# Altium footprint library Dart_Controller_Pcblib.PcbLib: 132 footprints (part 7 of 9)
Each footprint in its own frame and in the unit in brackets; x right, y up, seen from the top. Pads: shape width x height; smd on the part's side, far side on the other; paste and mask are expansions set on the pad; w line width, h text height; cw(c..) or ccw(c..) is an arc to the next point about the centre after c.
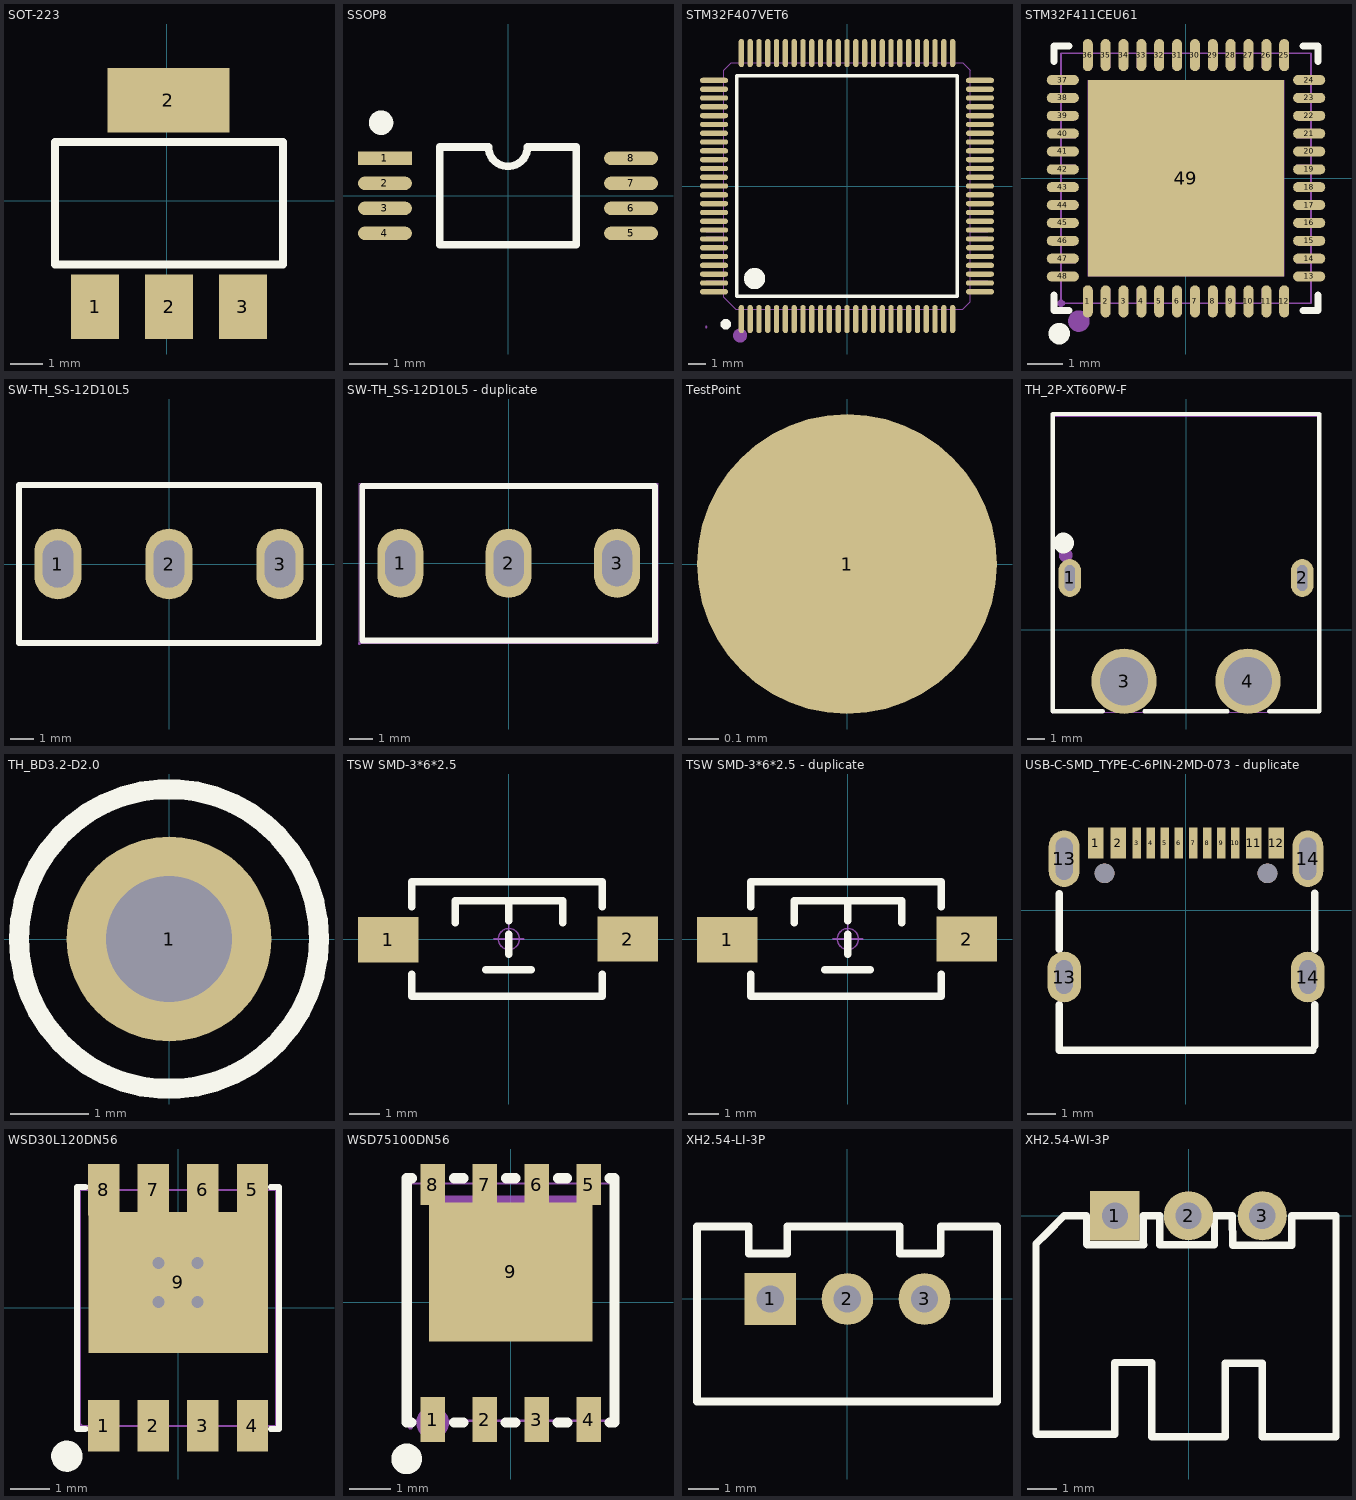
[diagram p6: the footprints below, top view; thin cyan lines are the x and y axes]

## SOT-223 [mil]
pads (4):
  rect 59x79 smd: 1(-88,-130) 2(2.55,-130) 3(93.1,-130)
  rect 150x79 smd: 2(1.88,123.54)
Top Overlay:
  lines w10: -137.45,-78 -137.45,72 142.55,72 142.55,-78 -137.45,-78
3D body "SOT-223_MP04A.STEP": height 66.93, standoff 0, extent -126.41,-138.72 129.5,135.3

## SSOP8 [mm] "3*6.4*1.2mm（蒜米工坊）"
height 9.4
pads (8):
  rect 1.4x0.35 smd: 1(-3.2,0.975)
  oval 1.4x0.35 smd: 2(-3.2,0.325) 3(-3.2,-0.325) 4(-3.2,-0.975) 5(3.2,-0.975) 6(3.2,-0.325) 7(3.2,0.325) 8(3.2,0.975)
Top Overlay:
  circle w0.381: c-3.3,1.9 r0.127
  lines w0.2: -1.778,-1.27 1.778,-1.27 1.778,1.27 0.508,1.27 cw(c0,1.27) -0.508,1.27 -1.778,1.27 -1.778,-1.27
3D body "SSOP8.STEP": height 1.25, standoff -0.03, extent -3.202,-1.75 3.202,1.75

## STM32F407VET6 [mm]
pads (100):
  oval 0.3x1.6 smd paste-100 mask+0.051: 1(-6,-7.55) 2(-5.5,-7.55) 3(-5,-7.55) 4(-4.5,-7.55) 5(-4,-7.55) 6(-3.5,-7.55) 7(-3,-7.55) 8(-2.5,-7.55) 9(-2,-7.55) 10(-1.5,-7.55) 11(-1,-7.55) 12(-0.5,-7.55) 13(0,-7.55) 14(0.5,-7.55) 15(1,-7.55) 16(1.5,-7.55) 17(2,-7.55) 18(2.5,-7.55) 19(3,-7.55) 20(3.5,-7.55) 21(4,-7.55) 22(4.5,-7.55) 23(5,-7.55) 24(5.5,-7.55) 25(6,-7.55) 51(6,7.55) 52(5.5,7.55) 53(5,7.55) 54(4.5,7.55) 55(4,7.55) 56(3.5,7.55) 57(3,7.55) 58(2.5,7.55) 59(2,7.55) 60(1.5,7.55) 61(1,7.55) 62(0.5,7.55) 63(0,7.55) 64(-0.5,7.55) 65(-1,7.55) 66(-1.5,7.55) 67(-2,7.55) 68(-2.5,7.55) 69(-3,7.55) 70(-3.5,7.55) 71(-4,7.55) 72(-4.5,7.55) 73(-5,7.55) 74(-5.5,7.55) 75(-6,7.55)
  oval 1.6x0.3 smd paste-100 mask+0.051: 26(7.55,-6) 27(7.55,-5.5) 28(7.55,-5) 29(7.55,-4.5) 30(7.55,-4) 31(7.55,-3.5) 32(7.55,-3) 33(7.55,-2.5) 34(7.55,-2) 35(7.55,-1.5) 36(7.55,-1) 37(7.55,-0.5) 38(7.55,0) 39(7.55,0.5) 40(7.55,1) 41(7.55,1.5) 42(7.55,2) 43(7.55,2.5) 44(7.55,3) 45(7.55,3.5) 46(7.55,4) 47(7.55,4.5) 48(7.55,5) 49(7.55,5.5) 50(7.55,6) 76(-7.55,6) 77(-7.55,5.5) 78(-7.55,5) 79(-7.55,4.5) 80(-7.55,4) 81(-7.55,3.5) 82(-7.55,3) 83(-7.55,2.5) 84(-7.55,2) 85(-7.55,1.5) 86(-7.55,1) 87(-7.55,0.5) 88(-7.55,0) 89(-7.55,-0.5) 90(-7.55,-1) 91(-7.55,-1.5) 92(-7.55,-2) 93(-7.55,-2.5) 94(-7.55,-3) 95(-7.55,-3.5) 96(-7.55,-4) 97(-7.55,-4.5) 98(-7.55,-5) 99(-7.55,-5.5) 100(-7.55,-6)
Top Overlay:
  lines w0.2: -6.25,-6.25 6.25,-6.25 6.25,6.25 -6.25,6.25 -6.25,-6.25
  lines w0.3: -6.883,-7.696 ccw(c-6.882,-7.846) -6.882,-7.996 ccw(c-6.882,-7.846) -6.881,-7.696
  lines w0.6: -5.25,-4.95 ccw(c-5.248,-5.25) -5.248,-5.55 ccw(c-5.248,-5.25) -5.245,-4.95
Top Paste:
  drawing of 100 lines, arcs and shapes, not listed
Mechanical 6:
  circle w0.4: c-6.071,-8.484 r0.2
Mechanical 15:
  drawing of 209 lines, arcs and shapes, not listed

## STM32F411CEU61 [mm]
pads (49):
  oval 0.28x0.9 smd: 1(-2.751,-3.449) 2(-2.25,-3.449) 3(-1.75,-3.449) 4(-1.25,-3.449) 5(-0.749,-3.449) 6(-0.249,-3.449) 7(0.249,-3.449) 8(0.749,-3.449) 9(1.25,-3.449) 10(1.75,-3.449) 11(2.251,-3.449) 12(2.751,-3.449) 25(2.751,3.449) 26(2.251,3.449) 27(1.75,3.449) 28(1.25,3.449) 29(0.749,3.449) 30(0.249,3.449) 31(-0.249,3.449) 32(-0.749,3.449) 33(-1.25,3.449) 34(-1.75,3.449) 35(-2.25,3.449) 36(-2.751,3.449)
  oval 0.9x0.28 smd: 13(3.449,-2.751) 14(3.449,-2.251) 15(3.449,-1.75) 16(3.449,-1.25) 17(3.449,-0.749) 18(3.449,-0.249) 19(3.449,0.249) 20(3.449,0.749) 21(3.449,1.25) 22(3.449,1.75) 23(3.449,2.25) 24(3.449,2.751) 37(-3.449,2.751) 38(-3.449,2.25) 39(-3.449,1.75) 40(-3.449,1.25) 41(-3.449,0.749) 42(-3.449,0.249) 43(-3.449,-0.249) 44(-3.449,-0.749) 45(-3.449,-1.25) 46(-3.449,-1.75) 47(-3.449,-2.251) 48(-3.449,-2.751)
  rect 5.5x5.5 smd: 49(0,0)
Top Overlay:
  lines w0.2: -3.7,-3.275 -3.7,-3.7 -3.275,-3.7 ; -3.7,3.275 -3.7,3.7 -3.275,3.7 ; 3.275,-3.7 3.7,-3.7 3.7,-3.275 ; 3.275,3.7 3.7,3.7 3.7,3.275
  lines w0.3: -3.551,-4.201 ccw(c-3.55,-4.351) -3.55,-4.501 ccw(c-3.55,-4.351) -3.548,-4.201
Mechanical 6:
  circle w0.3: c-3,-4 r0.15
Mechanical 15:
  drawing of 54 lines, arcs and shapes, not listed
3D body "F411-PCBModelSOLID.step": height 0.61, standoff 0, extent -3.5,-3.5 3.5,3.5

## SW-TH_SS-12D10L5 [mm]
pads (3):
  oval 2x3 hole 1.3 slot 2 at 90 deg paste-2539.97 mask+0.051: 1(-4.7,0) 2(0,0) 3(4.7,0)
Top Overlay:
  lines w0.254: -6.35,-3.35 6.35,-3.35 6.35,3.35 -6.35,3.35 -6.35,-3.35
3D body "SS12_CORR.step": height 10.1, standoff -7, extent -6.5,-3.4 6.501,3.4

## SW-TH_SS-12D10L5 - duplicate [mm]
pads (3):
  oval 2x3 hole 1.3 slot 2 at 90 deg: 1(-4.7,0) 2(0,0) 3(4.7,0)
Top Overlay:
  lines w0.254: -6.35,-3.35 -6.35,3.35 6.35,3.35 6.35,-3.35 -6.35,-3.35
Mechanical 15:
  region: -5.1,0.65 -4.3,0.65 -4.3,-0.65 -5.1,-0.65
  region: -0.4,0.65 0.4,0.65 0.4,-0.65 -0.4,-0.65
  region: 4.3,0.65 5.1,0.65 5.1,-0.65 4.3,-0.65
  region: -6.417,-3.477 -6.417,-3.452 -6.452,-3.417 -6.502,-3.417 -6.537,-3.452 -6.537,-3.477 -6.537,-3.502 -6.502,-3.537 -6.452,-3.537 -6.417,-3.502
  lines w0.051: -6.477,-3.477 -6.477,3.477 6.477,3.477 6.477,-3.477 -6.477,-3.477
3D body "滑动开关-PCBModelCOMPOUND.step": height 10.1, standoff -7, extent -6.35,-3.429 6.651,3.371

## TestPoint [mm]
pads (1):
  round 1 smd mask+0: 1(0,0)

## TH_2P-XT60PW-F [mm]
pads (4):
  oval 1.3x2.2 hole 0.6 slot 1.5 at 90 deg paste-2539.97 mask+0.05: 1(-6.75,3) 2(6.75,3)
  round 3.8 hole 2.8 paste-2539.97 mask+0.05: 3(-3.6,-3) 4(3.6,-3)
Top Overlay:
  circle w0.6: c-7.112,5.032 r0.3
  lines w0.254: -4.826,-4.747 -7.747,-4.747 -7.747,12.525 7.747,12.525 7.747,-4.747 4.826,-4.747 ; -2.413,-4.747 2.413,-4.747
Mechanical 6:
  circle w0.4: c-6.985,4.318 r0.2
Mechanical 15:
  region: -6.575,3.55 -6.575,2.45 -6.925,2.45 -6.925,3.55
  region: 6.925,3.55 6.925,2.45 6.575,2.45 6.575,3.55
  region: -2.35,-3 -2.35,-2.835 -2.435,-2.517 -2.6,-2.232 -2.832,-2 -3.117,-1.835 -3.435,-1.75 -3.765,-1.75 -4.083,-1.835 -4.368,-2 -4.6,-2.232 -4.765,-2.518 -4.85,-2.835 -4.85,-3 -4.85,-3.165 -4.765,-3.483 -4.6,-3.768 -4.368,-4 -4.083,-4.165 -3.765,-4.25 -3.435,-4.25 -3.117,-4.165 -2.832,-4 -2.6,-3.768 -2.435,-3.483 -2.35,-3.165
  region: 4.85,-3 4.85,-2.835 4.765,-2.517 4.6,-2.232 4.367,-2 4.082,-1.835 3.764,-1.75 3.435,-1.75 3.117,-1.835 2.832,-2 2.599,-2.232 2.435,-2.518 2.35,-2.835 2.35,-3 2.35,-3.165 2.435,-3.483 2.6,-3.768 2.832,-4 3.117,-4.165 3.435,-4.25 3.765,-4.25 4.082,-4.165 4.368,-4 4.6,-3.768 4.765,-3.483 4.85,-3.165
  region: -7.69,-4.8 -7.69,-4.775 -7.725,-4.74 -7.775,-4.74 -7.81,-4.775 -7.81,-4.8 -7.81,-4.825 -7.775,-4.86 -7.725,-4.86 -7.69,-4.825
  lines w0.051: -7.75,-4.8 -7.75,12.4 7.75,12.4 7.75,-4.8 -7.75,-4.8

## TH_BD3.2-D2.0 [mm]
pads (1):
  round 2.6 hole 1.6: 1(0,0)
Top Overlay:
  circle w0.254: c0,0 r1.905

## TSW SMD-3*6*2.5 [mm] "3*6*2.5mm"
pads (2):
  rect 2x1.5 smd: 1(-3.996,-0.02) 2(3.937,0)
Top Overlay:
  lines w0.254: -3.212,-1.168 -3.212,-1.9 3.088,-1.9 3.088,-1.168 ; -3.212,1.067 -3.212,1.9 3.088,1.9 3.088,1.067 ; -1.778,0.533 -1.778,1.27 1.778,1.27 1.778,0.533 ; -0.762,-1.016 0.737,-1.016 ; 0,-0.508 0,0.152 ; 0,0.61 0,1.27
Mechanical 15:
  circle w0.05: c0,0 r0.35
  lines w0.05: -0.5,0 0.5,0 ; 0,-0.5 0,0.5
3D body "TSW SMD-3x6x2.5.STEP": height 2.59, standoff -0.03, extent -4,-1.877 4,1.623

## TSW SMD-3*6*2.5 - duplicate [mm] "3*6*2.5mm"
pads (2):
  rect 2x1.5 smd: 1(-3.996,-0.02) 2(3.937,0)
Top Overlay:
  lines w0.254: -3.212,-1.168 -3.212,-1.9 3.088,-1.9 3.088,-1.168 ; -3.212,1.067 -3.212,1.9 3.088,1.9 3.088,1.067 ; -1.778,0.533 -1.778,1.27 1.778,1.27 1.778,0.533 ; -0.762,-1.016 0.737,-1.016 ; 0,-0.508 0,0.152 ; 0,0.61 0,1.27
Mechanical 15:
  circle w0.05: c0,0 r0.35
  lines w0.05: -0.5,0 0.5,0 ; 0,-0.5 0,0.5
3D body "SWITCH.step": height 5.02, standoff 0, extent -4,-1.751 4,1.75

## USB-C-SMD_TYPE-C-6PIN-2MD-073 - duplicate [mm]
pads (18):
  rect 0.55x1.1 smd paste-100 mask+0.05: 1(-3.2,2.375) 2(-2.4,2.375) 11(2.4,2.375) 12(3.2,2.375)
  rect 0.3x1.1 smd paste-100 mask+0.05: 3(-1.75,2.375) 4(-1.25,2.375) 5(-0.75,2.375) 6(-0.25,2.375) 7(0.25,2.375) 8(0.75,2.375) 9(1.25,2.375) 10(1.75,2.375)
  oval 1.2x1.8 hole 0.6 slot 1.2 at 90 deg paste-2539.97 mask+0.05: 13(-4.325,-2.375) 14(4.325,-2.375)
  oval 1.1x2 hole 0.6 slot 1.5 at 90 deg paste-2539.97 mask+0.05: 13(-4.325,1.825) 14(4.325,1.825)
  round 0.7 hole 0.7 unplated paste-2539.97: ""(-2.89,1.305) ""(2.89,1.305)
Top Overlay:
  lines w0.254: -4.5,-3.356 -4.5,-4.975 4.5,-4.975 ; -4.5,-1.394 -4.5,0.594 ; 4.572,-4.826 4.572,-3.353 ; 4.572,-1.397 4.572,0.597
Top Paste:
  drawing of 16 lines, arcs and shapes, not listed
Mechanical 15:
  circle w0.25: c2.89,1.305 r0.125
  circle w0.25: c-2.89,1.305 r0.125
3D body "typeC_CORR.step": height 3.26, standoff -0.9, extent -4.47,-4.99 4.47,2.59

## WSD30L120DN56 [mm] "增强PMOS"
pads (9):
  rect 0.8x1.321 smd paste-100 mask+0.051: 1(-1.905,-3.025) 2(-0.635,-3.025) 3(0.635,-3.025) 4(1.905,-3.025) 5(1.905,3.025) 6(0.635,3.025) 7(-0.635,3.025) 8(-1.905,3.025)
  rect 4.6x3.6 smd paste-100 mask+0.051: 9(0,0.65)
via -0.5,1.15 diameter 0.61 hole 0.305
via 0.5,1.15 diameter 0.61 hole 0.305
via -0.5,0.15 diameter 0.61 hole 0.305
via 0.5,0.15 diameter 0.61 hole 0.305
Top Overlay:
  circle w0.4: c-2.85,-3.8 r0.2
  lines w0.152: -2.376,-3.101 -2.586,-3.101 -2.586,3.101 -2.376,3.101 ; 2.376,-3.101 2.586,-3.101 2.586,3.101 2.376,3.101
Top Paste:
  region: 2.305,2.365 2.305,3.686 1.505,3.686 1.505,2.45 1.035,2.45 1.035,3.686 0.235,3.686 0.235,2.45 -0.235,2.45 -0.235,3.686 -1.035,3.686 -1.035,2.45 -1.505,2.45 -1.505,3.686 -2.305,3.686 -2.305,2.365 -2.3,2.365 -2.3,-1.15 2.3,-1.15 2.3,2.365
  region: 1.505,-2.365 1.505,-3.686 2.305,-3.686 2.305,-2.365
  region: 1.035,-3.686 1.035,-2.365 0.235,-2.365 0.235,-3.686
  region: -0.235,-3.686 -0.235,-2.365 -1.035,-2.365 -1.035,-3.686
  region: -1.505,-3.686 -1.505,-2.365 -2.305,-2.365 -2.305,-3.686
Mechanical 6:
  circle w0.2: c-1.905,-3.325 r0.1
Mechanical 15:
  region: -2.45,-3.025 -2.45,-3.001 -2.485,-2.966 -2.534,-2.966 -2.569,-3 -2.57,-3.025 -2.569,-3.049 -2.535,-3.084 -2.486,-3.084 -2.451,-3.049
  region: -2.105,-3.025 -2.105,-2.39 -1.705,-2.39 -1.705,-3.025
  region: -0.835,-3.025 -0.835,-2.39 -0.435,-2.39 -0.435,-3.025
  region: 0.435,-3.025 0.435,-2.39 0.835,-2.39 0.835,-3.025
  region: 1.705,-3.025 1.705,-2.39 2.105,-2.39 2.105,-3.025
  region: 1.705,3.025 1.705,2.39 2.105,2.39 2.105,3.025
  region: 0.435,3.025 0.435,2.39 0.835,2.39 0.835,3.025
  region: -0.835,3.025 -0.835,2.39 -0.435,2.39 -0.435,3.025
  region: -2.105,3.025 -2.105,2.39 -1.705,2.39 -1.705,3.025
  region: -2.005,-0.74 -2.005,2.387 2.005,2.387 2.005,-1.088 -1.658,-1.088
  lines w0.051: -2.51,-3.025 -2.51,3.025 2.51,3.025 2.51,-3.025 -2.51,-3.025
3D body "PMOS-PCBModelVBmV-Q1.step": height 1.01, standoff 0, extent -2.54,-3.05 2.74,3.05

## WSD75100DN56 [mm] "NMOS"
pads (9):
  rect 0.6x1.1 smd paste-100 mask+0.051: 1(-1.905,-2.875) 2(-0.635,-2.875) 3(0.635,-2.875) 4(1.905,-2.875)
  rect 0.6x1 smd paste-100 mask+0.051: 5(1.905,2.875) 6(0.635,2.875) 7(-0.635,2.875) 8(-1.905,2.875)
  rect 4x3.4 smd paste-100 mask+0.051: 9(0,0.738)
Top Overlay:
  lines w0.254: -2.429,-2.942 -2.543,-2.942 -2.543,3.027 -2.424,3.027 ; -1.386,-2.942 -1.159,-2.942 ; -1.381,3.027 -1.154,3.027 ; -0.116,-2.942 0.111,-2.942 ; -0.111,3.027 0.116,3.027 ; 1.154,-2.942 1.381,-2.942 ; 1.159,3.027 1.376,3.027 ; 2.419,3.027 2.537,3.027 2.537,-2.942 2.424,-2.942
  lines w0.5: -2.67,-3.835 ccw(c-2.545,-3.834) -2.421,-3.834 ccw(c-2.545,-3.834) -2.67,-3.833
Top Paste:
  region: 2.205,-3.425 2.205,-2.325 1.605,-2.325 1.605,-3.425
  region: 0.935,-3.425 0.935,-2.325 0.335,-2.325 0.335,-3.425
  region: -0.335,-3.425 -0.335,-2.325 -0.935,-2.325 -0.935,-3.425
  region: -1.605,-3.425 -1.605,-2.325 -2.205,-2.325 -2.205,-3.425
  region: -2.21,3.378 -2.21,2.368 -2,2.368 -2,-0.962 2,-0.962 2,2.368 2.21,2.368 2.21,3.378 1.6,3.378 1.6,2.438 0.94,2.438 0.94,3.378 0.32,3.378 0.32,2.438 -0.33,2.438 -0.33,3.378 -0.94,3.378 -0.94,2.438 -1.6,2.438 -1.6,3.378
Mechanical 6:
  circle w0.4: c-1.908,-2.946 r0.2
Mechanical 15:
  region: -2.39,-3.05 -2.39,-3.025 -2.425,-2.99 -2.475,-2.99 -2.51,-3.025 -2.51,-3.05 -2.51,-3.075 -2.475,-3.11 -2.425,-3.11 -2.39,-3.075
  region: -1.95,2.6 1.95,2.6 1.95,-0.8 -1.95,-0.8
  region: 1.7,-2.6 2.11,-2.6 2.11,-3.05 1.7,-3.05
  region: 0.43,-2.6 0.84,-2.6 0.84,-3.05 0.43,-3.05
  region: -0.84,-2.6 -0.43,-2.6 -0.43,-3.05 -0.84,-3.05
  region: -2.11,-2.6 -1.7,-2.6 -1.7,-3.05 -2.11,-3.05
  region: 2.11,2.6 1.7,2.6 1.7,3.05 2.11,3.05
  region: 0.84,2.6 0.43,2.6 0.43,3.05 0.84,3.05
  region: -0.43,2.6 -0.84,2.6 -0.84,3.05 -0.43,3.05
  region: -1.7,2.6 -2.11,2.6 -2.11,3.05 -1.7,3.05
  lines w0.051: -2.45,-2.9 2.45,-2.9 2.45,2.9 -2.45,2.9 -2.45,-2.9
3D body "NMOS-PCBModelDFN-8_L5.8-W4.9-P1.27-LS6.1-BL.step": height 1.13, standoff 0, extent -2.423,-3.089 2.677,2.962

## XH2.54-LI-3P [mm] "接插件，3P  淘宝ID:黄晶宝石   店铺网址:https://shop463601444.taobao.com"
pads (3):
  rect 1.7x1.7 hole 0.9: 1(-2.54,0)
  round 1.7 hole 0.9: 2(0,0) 3(2.54,0)
Top Overlay:
  lines w0.254: -4.953,-3.378 4.928,-3.378 4.928,2.388 3.073,2.388 3.073,1.5 1.727,1.5 1.727,2.388 -1.981,2.388 -1.981,1.5 -3.251,1.5 -3.251,2.388 -4.953,2.388 -4.953,-3.378
3D body "XH2.54-3P.STEP": height 7.03, standoff -2.47, extent -5.04,-3.3 5.04,2.4

## XH2.54-WI-3P [mm] "接插件，3P"
pads (3):
  rect 1.7x1.7 hole 0.9: 1(-2.54,0)
  round 1.7 hole 0.9: 2(0,0) 3(2.54,0)
Top Overlay:
  lines w0.254: 0.894,0 0.894,-0.988 0.88,-1.002 -0.986,-1.002 -0.986,0 -1.558,0 -1.558,-0.982 -1.544,-0.996 -3.5,-0.996 -3.514,-0.982 -3.514,0 -4.29,0 -4.872,-0.582 -5.256,-0.966 -5.256,-7.502 -5.23,-7.528 -2.54,-7.528 -2.54,-5.058 -1.27,-5.058 -1.27,-7.62 0,-7.62 1.27,-7.62 1.27,-5.08 2.54,-5.08 2.54,-7.62 5.08,-7.62 5.08,0 4.044,0 3.556,0 3.556,-1.016 1.524,-1.016 1.504,0 0.906,0
3D body "XH2.54-3P_H.STEP": height 5.73, standoff -3.37, extent -5.04,-7.35 5.04,0.35